# Altium footprint library Connectors.PcbLib: 101 footprints (part 5 of 7)
Each footprint in its own frame and in the unit in brackets; x right, y up, seen from the top. Pads: shape width x height; smd on the part's side, far side on the other; paste and mask are expansions set on the pad; w line width, h text height; cw(c..) or ccw(c..) is an arc to the next point about the centre after c.
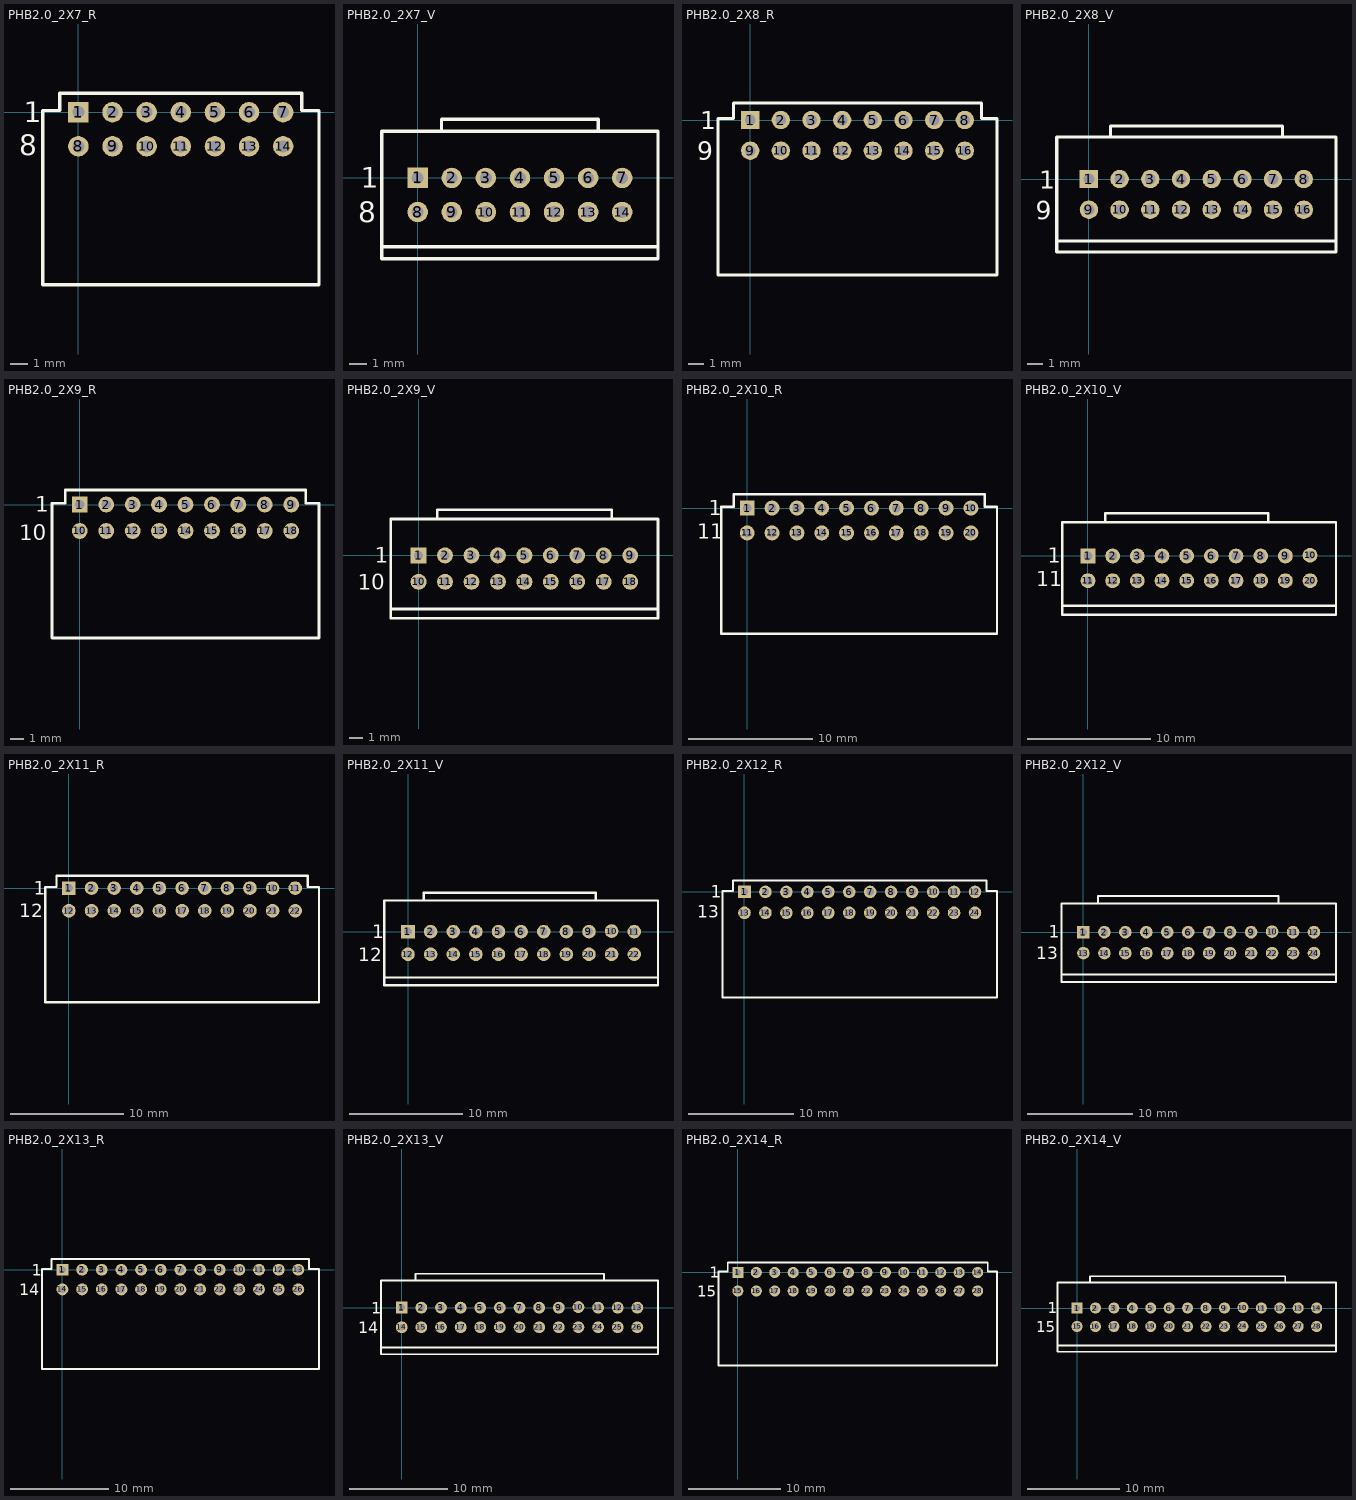
[diagram p4: the footprints below, top view; thin cyan lines are the x and y axes]

## PHB2.0_2X7_R [mm] "PHB2.0 , 7-Pin, Dual row, Right Angle"
pads (14):
  rect 1.2x1.2 hole 0.7 paste+0 mask+0.1: 1(0,0)
  round 1.2 hole 0.7 paste+0 mask+0.1: 2(2,0) 3(4,0) 4(6,0) 5(8,0) 6(10,0) 7(12,0) 8(0,-2) 9(2,-2) 10(4,-2) 11(6,-2) 12(8,-2) 13(10,-2) 14(12,-2)
Top Overlay:
  lines w0.2: -1.1,1.1 -1.1,0.1 -2.1,0.1 -2.1,-10.1 14.1,-10.1 14.1,0.1 13.1,0.1 13.1,1.1 -1.09,1.1
  text "8" at -3.48,-2.53 h1.2
  text "1" at -3.19,-0.6 h1.2
3D body "878331419.stp": height 7.25, standoff -1.21, extent -2.325,-8.4 14.325,0.25

## PHB2.0_2X7_V [mm] "PHB2.0 , 7-Pin, Dual row, Vertical"
pads (14):
  rect 1.2x1.2 hole 0.7 paste+0 mask+0.1: 1(0,0)
  round 1.2 hole 0.7 paste+0 mask+0.1: 2(2,0) 3(4,0) 4(6,0) 5(8,0) 6(10,0) 7(12,0) 8(0,-2) 9(2,-2) 10(4,-2) 11(6,-2) 12(8,-2) 13(10,-2) 14(12,-2)
Top Overlay:
  lines w0.2: -2.1,-4.05 14.1,-4.05 ; 1.4,2.755 1.4,3.45 10.6,3.45 10.6,2.765 ; -2.1,-4.75 14.1,-4.75 14.1,2.75 -2.1,2.75 -2.1,-4.75
  text "8" at -3.5,-2.6 h1.2
  text "1" at -3.34,-0.58 h1.2
3D body "878311419.stp": height 7.7, standoff -1.2, extent -2.325,-4.15 14.325,2.15

## PHB2.0_2X8_R [mm] "PHB2.0 , 8-Pin, Dual row, Right Angle"
pads (16):
  rect 1.2x1.2 hole 0.7 paste+0 mask+0.1: 1(0,0)
  round 1.2 hole 0.7 paste+0 mask+0.1: 2(2,0) 3(4,0) 4(6,0) 5(8,0) 6(10,0) 7(12,0) 8(14,0) 9(0,-2) 10(2,-2) 11(4,-2) 12(6,-2) 13(8,-2) 14(10,-2) 15(12,-2) 16(14,-2)
Top Overlay:
  lines w0.2: -1.1,1.1 -1.1,0.1 -2.1,0.1 -2.1,-10.1 16.1,-10.1 16.1,0.1 15.1,0.1 15.1,1.1 -1.09,1.1
  text "9" at -3.47,-2.6 h1.2
  text "1" at -3.26,-0.6 h1.2
3D body "878331619.stp": height 7.25, standoff -1.21, extent -2.325,-8.4 16.325,0.25

## PHB2.0_2X8_V [mm] "PHB2.0 , 8-Pin, Dual row, Vertical"
pads (16):
  rect 1.2x1.2 hole 0.7 paste+0 mask+0.1: 1(0,0)
  round 1.2 hole 0.7 paste+0 mask+0.1: 2(2,0) 3(4,0) 4(6,0) 5(8,0) 6(10,0) 7(12,0) 8(14,0) 9(0,-2) 10(2,-2) 11(4,-2) 12(6,-2) 13(8,-2) 14(10,-2) 15(12,-2) 16(14,-2)
Top Overlay:
  lines w0.2: -2.1,-4.05 16.1,-4.05 ; 1.4,2.755 1.4,3.45 12.6,3.45 12.6,2.765 ; -2.1,-4.75 16.1,-4.75 16.1,2.75 -2.1,2.75 -2.1,-4.75
  text "9" at -3.45,-2.62 h1.2
  text "1" at -3.23,-0.63 h1.2
3D body "878311619.stp": height 7.7, standoff -1.2, extent -2.39,-4.12 16.26,2.18

## PHB2.0_2X9_R [mm] "PHB2.0 , 9-Pin, Dual row, Right Angle"
pads (18):
  rect 1.2x1.2 hole 0.7 paste+0 mask+0.1: 1(0,0)
  round 1.2 hole 0.7 paste+0 mask+0.1: 2(2,0) 3(4,0) 4(6,0) 5(8,0) 6(10,0) 7(12,0) 8(14,0) 9(16,0) 10(0,-2) 11(2,-2) 12(4,-2) 13(6,-2) 14(8,-2) 15(10,-2) 16(12,-2) 17(14,-2) 18(16,-2)
Top Overlay:
  lines w0.2: -1.1,1.1 -1.1,0.1 -2.1,0.1 -2.1,-10.1 18.1,-10.1 18.1,0.1 17.1,0.1 17.1,1.1 -1.09,1.1
  text "10" at -4.6,-2.71 h1.2
  text "1" at -3.36,-0.54 h1.2
3D body "878331819.stp": height 7.25, standoff -1.21, extent -2.325,-8.4 18.325,0.25

## PHB2.0_2X9_V [mm] "PHB2.0 , 9-Pin, Dual row, Vertical"
pads (18):
  rect 1.2x1.2 hole 0.7 paste+0 mask+0.1: 1(0,0)
  round 1.2 hole 0.7 paste+0 mask+0.1: 2(2,0) 3(4,0) 4(6,0) 5(8,0) 6(10,0) 7(12,0) 8(14,0) 9(16,0) 10(0,-2) 11(2,-2) 12(4,-2) 13(6,-2) 14(8,-2) 15(10,-2) 16(12,-2) 17(14,-2) 18(16,-2)
Top Overlay:
  lines w0.2: -2.1,-4.05 18.1,-4.05 ; 1.4,2.755 1.4,3.45 14.6,3.45 14.6,2.765 ; -2.1,-4.75 -2.1,2.75 18.1,2.75 18.1,-4.75 -2.1,-4.75
  text "10" at -4.58,-2.59 h1.2
  text "1" at -3.3,-0.55 h1.2
3D body "878311819.stp": height 7.7, standoff -1.2, extent -2.325,-4.15 18.325,2.15

## PHB2.0_2X10_R [mm] "PHB2.0 , 10-Pin, Dual row, Right Angle"
pads (20):
  rect 1.2x1.2 hole 0.7 paste+0 mask+0.1: 1(0,0)
  round 1.2 hole 0.7 paste+0 mask+0.1: 2(2,0) 3(4,0) 4(6,0) 5(8,0) 6(10,0) 7(12,0) 8(14,0) 9(16,0) 10(18,0) 11(0,-2) 12(2,-2) 13(4,-2) 14(6,-2) 15(8,-2) 16(10,-2) 17(12,-2) 18(14,-2) 19(16,-2) 20(18,-2)
Top Overlay:
  lines w0.2: -1.1,1.1 -1.1,0.1 -2.1,0.1 -2.1,-10.1 20.1,-10.1 20.1,0.1 19.1,0.1 19.1,1.1 -1.09,1.1
  text "11" at -4.04,-2.48 h1.2
  text "1" at -3.08,-0.56 h1.2
3D body "878332019.stp": height 7.25, standoff -1.21, extent -2.325,-8.4 20.325,0.25

## PHB2.0_2X10_V [mm] "PHB2.0 , 10-Pin, Dual row, Vertical"
pads (20):
  rect 1.2x1.2 hole 0.7 paste+0 mask+0.1: 1(0,0)
  round 1.2 hole 0.7 paste+0 mask+0.1: 2(2,0) 3(4,0) 4(6,0) 5(8,0) 6(10,0) 7(12,0) 8(14,0) 9(16,0) 10(18,0.055) 11(0,-2) 12(2,-2) 13(4,-2) 14(6,-2) 15(8,-2) 16(10,-2) 17(12,-2) 18(14,-2) 19(16,-2) 20(18,-2)
Top Overlay:
  lines w0.2: -2.1,-4.05 20.1,-4.05 ; 1.4,2.755 1.4,3.45 14.6,3.45 14.6,2.765 ; -2.1,-4.75 -2.1,2.75 20.1,2.75 20.1,-4.75 -2.1,-4.75
  text "11" at -4.21,-2.44 h1.2
  text "1" at -3.26,-0.56 h1.2
3D body "878312019.stp": height 7.7, standoff -1.2, extent -2.325,-4.15 20.325,2.15

## PHB2.0_2X11_R [mm] "PHB2.0 , 11-Pin, Dual row, Right Angle"
pads (22):
  rect 1.2x1.2 hole 0.7 paste+0 mask+0.1: 1(0,0)
  round 1.2 hole 0.7 paste+0 mask+0.1: 2(2,0) 3(4,0) 4(6,0) 5(8,0) 6(10,0) 7(12,0) 8(14,0) 9(16,0) 10(18,0) 11(20,0) 12(0,-2) 13(2,-2) 14(4,-2) 15(6,-2) 16(8,-2) 17(10,-2) 18(12,-2) 19(14,-2) 20(16,-2) 21(18,-2) 22(20,-2)
Top Overlay:
  lines w0.2: -1.1,1.1 -1.1,0.1 -2.1,0.1 -2.1,-10.1 22.1,-10.1 22.1,0.1 21.1,0.1 21.1,1.1 -1.09,1.1
  text "12" at -4.41,-2.56 h1.2
  text "1" at -3.11,-0.61 h1.2
3D body "878332219.stp": height 7.25, standoff -1.21, extent -2.325,-8.4 22.325,0.25

## PHB2.0_2X11_V [mm] "PHB2.0 , 11-Pin, Dual row, Vertical"
pads (22):
  rect 1.2x1.2 hole 0.7 paste+0 mask+0.1: 1(0,0)
  round 1.2 hole 0.7 paste+0 mask+0.1: 2(2,0) 3(4,0) 4(6,0) 5(8,0) 6(10,0) 7(12,0) 8(14,0) 9(16,0) 10(18,0.055) 11(20,0) 12(0,-2) 13(2,-2) 14(4,-2) 15(6,-2) 16(8,-2) 17(10,-2) 18(12,-2) 19(14,-2) 20(16,-2) 21(18,-2) 22(20,-2)
Top Overlay:
  lines w0.2: -2.1,-4.05 22.1,-4.05 ; 1.4,2.755 1.4,3.45 16.6,3.45 16.6,2.765 ; -2.1,-4.75 22.1,-4.75 22.1,2.75 -2.1,2.75 -2.1,-4.75
  text "12" at -4.42,-2.62 h1.2
  text "1" at -3.17,-0.59 h1.2
3D body "878312219.stp": height 7.7, standoff -1.2, extent -2.325,-4.15 22.325,2.15

## PHB2.0_2X12_R [mm] "PHB2.0 , 12-Pin, Dual row, Right Angle"
pads (24):
  rect 1.2x1.2 hole 0.7 paste+0 mask+0.1: 1(0,0)
  round 1.2 hole 0.7 paste+0 mask+0.1: 2(2,0) 3(4,0) 4(6,0) 5(8,0) 6(10,0) 7(12,0) 8(14,0) 9(16,0) 10(18,0) 11(20,0) 12(22,0) 13(0,-2) 14(2,-2) 15(4,-2) 16(6,-2) 17(8,-2) 18(10,-2) 19(12,-2) 20(14,-2) 21(16,-2) 22(18,-2) 23(20,-2) 24(22,-2)
Top Overlay:
  lines w0.2: -1.1,1.1 -1.1,0.1 -2.1,0.1 -2.1,-10.1 24.1,-10.1 24.1,0.1 23.1,0.1 23.1,1.1 -1.09,1.1
  text "13" at -4.53,-2.49 h1.2
  text "1" at -3.23,-0.56 h1.2
3D body "878332419.stp": height 7.25, standoff -1.21, extent -2.325,-8.4 24.325,0.25

## PHB2.0_2X12_V [mm] "PHB2.0 , 12-Pin, Dual row, Vertical"
pads (24):
  rect 1.2x1.2 hole 0.7 paste+0 mask+0.1: 1(0,0)
  round 1.2 hole 0.7 paste+0 mask+0.1: 2(2,0) 3(4,0) 4(6,0) 5(8,0) 6(10,0) 7(12,0) 8(14,0) 9(16,0) 10(18,0.055) 11(20,0) 12(22,0) 13(0,-2) 14(2,-2) 15(4,-2) 16(6,-2) 17(8,-2) 18(10,-2) 19(12,-2) 20(14,-2) 21(16,-2) 22(18,-2) 23(20,-2) 24(22,-2)
Top Overlay:
  lines w0.2: -2.1,-4.05 24.1,-4.05 ; 1.4,2.755 1.4,3.45 18.6,3.45 18.6,2.765 ; -2.1,-4.75 -2.1,2.75 24.1,2.75 24.1,-4.75 -2.1,-4.75
  text "13" at -4.52,-2.58 h1.2
  text "1" at -3.3,-0.53 h1.2
3D body "878312419.stp": height 7.7, standoff -1.2, extent -2.325,-4.15 24.325,2.15

## PHB2.0_2X13_R [mm] "PHB2.0 , 13-Pin, Dual row, Right Angle"
pads (26):
  rect 1.2x1.2 hole 0.7 paste+0 mask+0.1: 1(0,0)
  round 1.2 hole 0.7 paste+0 mask+0.1: 2(2,0) 3(4,0) 4(6,0) 5(8,0) 6(10,0) 7(12,0) 8(14,0) 9(16,0) 10(18,0) 11(20,0) 12(22,0) 13(24,0) 14(0,-2) 15(2,-2) 16(4,-2) 17(6,-2) 18(8,-2) 19(10,-2) 20(12,-2) 21(14,-2) 22(16,-2) 23(18,-2) 24(20,-2) 25(22,-2) 26(24,-2)
Top Overlay:
  lines w0.2: -1.1,1.1 -1.1,0.1 -2.1,0.1 -2.1,-10.1 26.1,-10.1 26.1,0.1 25.1,0.1 25.1,1.1 -1.09,1.1
  text "14" at -4.42,-2.58 h1.2
  text "1" at -3.13,-0.6 h1.2
3D body "878332619.stp": height 7.25, standoff -1.21, extent -2.325,-8.4 26.325,0.25

## PHB2.0_2X13_V [mm] "PHB2.0 , 13-Pin, Dual row, Vertical"
pads (26):
  rect 1.2x1.2 hole 0.7 paste+0 mask+0.1: 1(0,0)
  round 1.2 hole 0.7 paste+0 mask+0.1: 2(2,0) 3(4,0) 4(6,0) 5(8,0) 6(10,0) 7(12,0) 8(14,0) 9(16,0) 10(18,0.055) 11(20,0) 12(22,0) 13(24,0) 14(0,-2) 15(2,-2) 16(4,-2) 17(6,-2) 18(8,-2) 19(10,-2) 20(12,-2) 21(14,-2) 22(16,-2) 23(18,-2) 24(20,-2) 25(22,-2) 26(24,-2)
Top Overlay:
  lines w0.2: -2.1,-4.05 26.1,-4.05 ; 1.4,2.755 1.4,3.45 20.6,3.45 20.6,2.765 ; -2.1,-4.75 -2.1,2.75 26.1,2.75 26.1,-4.75 -2.1,-4.75
  text "1" at -3.1,-0.61 h1.2
  text "14" at -4.45,-2.59 h1.2
3D body "878312619.stp": height 7.7, standoff -1.2, extent -2.325,-4.15 26.325,2.15

## PHB2.0_2X14_R [mm] "PHB2.0 , 14-Pin, Dual row, Right Angle"
pads (28):
  rect 1.2x1.2 hole 0.7 paste+0 mask+0.1: 1(0,0)
  round 1.2 hole 0.7 paste+0 mask+0.1: 2(2,0) 3(4,0) 4(6,0) 5(8,0) 6(10,0) 7(12,0) 8(14,0) 9(16,0) 10(18,0) 11(20,0) 12(22,0) 13(24,0) 14(26,0) 15(0,-2) 16(2,-2) 17(4,-2) 18(6,-2) 19(8,-2) 20(10,-2) 21(12,-2) 22(14,-2) 23(16,-2) 24(18,-2) 25(20,-2) 26(22,-2) 27(24,-2) 28(26,-2)
Top Overlay:
  lines w0.2: -1.1,1.1 -1.1,0.1 -2.1,0.1 -2.1,-10.1 28.1,-10.1 28.1,0.1 27.1,0.1 27.1,1.1 -1.09,1.1
  text "1" at -3.07,-0.58 h1.2
  text "15" at -4.43,-2.63 h1.2
3D body "878332819.stp": height 7.25, standoff -1.21, extent -2.325,-8.4 28.325,0.25

## PHB2.0_2X14_V [mm] "PHB2.0 , 14-Pin, Dual row, Vertical"
pads (28):
  rect 1.2x1.2 hole 0.7 paste+0 mask+0.1: 1(0,0)
  round 1.2 hole 0.7 paste+0 mask+0.1: 2(2,0) 3(4,0) 4(6,0) 5(8,0) 6(10,0) 7(12,0) 8(14,0) 9(16,0) 10(18,0.055) 11(20,0) 12(22,0) 13(24,0) 14(26,0) 15(0,-2) 16(2,-2) 17(4,-2) 18(6,-2) 19(8,-2) 20(10,-2) 21(12,-2) 22(14,-2) 23(16,-2) 24(18,-2) 25(20,-2) 26(22,-2) 27(24,-2) 28(26,-2)
Top Overlay:
  lines w0.2: -2.1,-4.05 28.1,-4.05 ; 1.4,2.755 1.4,3.45 22.6,3.45 22.6,2.765 ; -2.1,-4.75 28.1,-4.75 28.1,2.75 -2.1,2.75 -2.1,-4.75
  text "1" at -3.15,-0.55 h1.2
  text "15" at -4.45,-2.61 h1.2
3D body "878312819.stp": height 7.7, standoff -1.2, extent -2.325,-4.15 28.325,2.15